# Altium footprint library ICs And Semiconductors SMD.PcbLib: 602 footprints (part 8 of 38) (continued)
## MINI-CIRCUITS_AF320 [mm] "MINI-CIRCUITS AF320 Case"
height 1.45
pads (4):
  rect 1.52x1.52 smd: 1(-2.16,0) 3(2.16,0)
  rect 2.03x1.65 smd: 2(0,-2.095) 4(0,2.095)
Top Overlay:
  circle w0.25: c-2.225,1.25 r0.125
  circle w0.2: c0,0 r0.865
  lines w0.2: -0.89,-0.255 -1.05,-0.255 -1.05,0.255 -0.89,0.255 ; -0.51,-0.749 -0.51,-0.92 0.51,-0.92 0.51,-0.749 ; -0.51,0.749 -0.51,0.92 0.51,0.92 0.51,0.749 ; 0.89,-0.255 1.05,-0.255 1.05,0.255 0.89,0.255 ; -0.89,-0.369 -0.89,0.369 -0.369,0.89 0.369,0.89 0.89,0.369 0.89,-0.369 0.369,-0.89 -0.369,-0.89 -0.89,-0.369
Mechanical 8:
  lines w0.1: -2.66,0 -2.16,0 ; -2.16,-0.5 -2.16,0 ; -2.16,0.5 -2.16,0 ; -1.66,0 -2.16,0 ; -0.5,-2.095 0,-2.095 ; -0.5,0 0,0 ; -0.5,2.095 0,2.095 ; 0,-2.595 0,-2.095 ; 0,-1.595 0,-2.095 ; 0,-1.27 0,1.27 ; 0,-0.5 0,0 ; 0,0.5 0,0 ; 0,1.595 0,2.095 ; 0,2.595 0,2.095 ; 0.5,-2.095 0,-2.095 ; 0.5,0 0,0 ; 0.5,2.095 0,2.095 ; 1.66,0 2.16,0 ; 2.16,-0.5 2.16,0 ; 2.16,0.5 2.16,0 ; 2.66,0 2.16,0 ; -2.92,-0.76 -1.4,-0.76 -1.4,0.76 -2.92,0.76 -2.92,-0.76 ; -1.015,-2.92 -1.015,-1.27 1.015,-1.27 1.015,-2.92 -1.015,-2.92 ; -1.015,1.27 -1.015,2.92 1.015,2.92 1.015,1.27 -1.015,1.27 ; 1.4,-0.76 2.92,-0.76 2.92,0.76 1.4,0.76 1.4,-0.76
Mechanical 14:
  circle w0.1: c0,0 r0.865
  lines w0.1: -2.31,-0.255 -1.8,0.255 ; -2.21,-0.255 -1.7,0.255 ; -2.11,-0.255 -1.6,0.255 ; -2.01,-0.255 -1.5,0.255 ; -0.89,-0.255 -2.54,-0.255 -2.03,0.255 -0.89,0.255 ; -0.51,-0.749 -0.51,-2.54 0.51,-2.54 0.51,-0.749 ; -0.51,0.749 -0.51,2.54 0.51,2.54 0.51,0.749 ; 0.89,-0.255 2.54,-0.255 2.54,0.255 0.89,0.255 ; -2.41,-0.255 -1.9,0.255 -2.41,-0.255 ; -0.89,-0.369 -0.89,0.369 -0.369,0.89 0.369,0.89 0.89,0.369 0.89,-0.369 0.369,-0.89 -0.369,-0.89 -0.89,-0.369
Mechanical 15:
  lines w0.05: -3.17,-1.01 -1.265,-1.01 -1.265,-3.17 1.265,-3.17 1.265,-1.01 3.17,-1.01 3.17,1.01 1.265,1.01 1.265,3.17 -1.265,3.17 -1.265,1.01 -3.17,1.01 -3.17,-1.01
3D body "MINI-CIRCUITS_AF320.stp": height 1.35, standoff 0, extent -2.54,-2.54 2.54,2.54

## MINI-CIRCUITS_CD542 [mm] "MINI-CIRCUITS CD542 Case, 2.54mm pitch; 6 pin, 5.59mm W X 7.87mm L"
height 2.84
pads (6):
  rect 2.54x1.65 smd: 1(-2.54,2.54) 2(-2.54,0) 3(-2.54,-2.54) 4(2.54,-2.54) 5(2.54,0) 6(2.54,2.54)
Top Overlay:
  circle w0.25: c-3.725,4.025 r0.125
  circle w0.6: c-0.35,2.8 r0.3
  lines w0.2: -2.795,-3.765 -2.795,-3.935 2.795,-3.935 2.795,-3.765 ; -2.795,3.765 -2.795,3.935 2.795,3.935 2.795,3.765
Mechanical 8:
  lines w0.1: -3.54,-2.54 -2.54,-2.54 ; -3.54,0 -2.54,0 ; -3.54,2.54 -2.54,2.54 ; -2.54,-3.54 -2.54,-2.54 ; -2.54,-1.54 -2.54,-2.54 ; -2.54,-1 -2.54,0 ; -2.54,1 -2.54,0 ; -2.54,1.54 -2.54,2.54 ; -2.54,3.54 -2.54,2.54 ; -1.54,-2.54 -2.54,-2.54 ; -1.54,0 -2.54,0 ; -1.54,2.54 -2.54,2.54 ; -1,0 0,0 ; 0,-1 0,0 ; 0,1 0,0 ; 1,0 0,0 ; 1.54,-2.54 2.54,-2.54 ; 1.54,0 2.54,0 ; 1.54,2.54 2.54,2.54 ; 2.54,-3.54 2.54,-2.54 ; 2.54,-1.54 2.54,-2.54 ; 2.54,-1 2.54,0 ; 2.54,1 2.54,0 ; 2.54,1.54 2.54,2.54 ; 2.54,3.54 2.54,2.54 ; 3.54,-2.54 2.54,-2.54 ; 3.54,0 2.54,0 ; 3.54,2.54 2.54,2.54
Mechanical 14:
  circle w0.1: c-1.595,2.85 r0.5
  lines w0.1: -2.795,-3.935 -2.795,3.935 2.795,3.935 2.795,-3.935 -2.795,-3.935
Mechanical 15:
  lines w0.05: -0.5,0 0.5,0 ; 0,-0.5 0,0.5 ; -4.06,-4.185 4.06,-4.185 4.06,4.185 -4.06,4.185 -4.06,-4.185
3D body "MINI-CIRCUITS_CD542.stp": height 2.84, standoff 0, extent -3.455,-3.935 3.455,3.935

## MINI-CIRCUITS_CD636 [mm] "MINI-CIRCUITS CD636 Case, 2.54mm pitch; 6 pin, 5.59mm W X 7.87mm L"
height 4.11
pads (6):
  rect 2.54x1.65 smd: 1(-2.54,2.54) 2(-2.54,0) 3(-2.54,-2.54) 4(2.54,-2.54) 5(2.54,0) 6(2.54,2.54)
Top Overlay:
  circle w0.25: c-3.725,4.025 r0.125
  circle w0.6: c-0.35,2.8 r0.3
  lines w0.2: -2.795,-3.765 -2.795,-3.935 2.795,-3.935 2.795,-3.765 ; -2.795,3.765 -2.795,3.935 2.795,3.935 2.795,3.765
Mechanical 8:
  lines w0.1: -3.54,-2.54 -2.54,-2.54 ; -3.54,0 -2.54,0 ; -3.54,2.54 -2.54,2.54 ; -2.54,-3.54 -2.54,-2.54 ; -2.54,-1.54 -2.54,-2.54 ; -2.54,-1 -2.54,0 ; -2.54,1 -2.54,0 ; -2.54,1.54 -2.54,2.54 ; -2.54,3.54 -2.54,2.54 ; -1.54,-2.54 -2.54,-2.54 ; -1.54,0 -2.54,0 ; -1.54,2.54 -2.54,2.54 ; -1,0 0,0 ; 0,-1 0,0 ; 0,1 0,0 ; 1,0 0,0 ; 1.54,-2.54 2.54,-2.54 ; 1.54,0 2.54,0 ; 1.54,2.54 2.54,2.54 ; 2.54,-3.54 2.54,-2.54 ; 2.54,-1.54 2.54,-2.54 ; 2.54,-1 2.54,0 ; 2.54,1 2.54,0 ; 2.54,1.54 2.54,2.54 ; 2.54,3.54 2.54,2.54 ; 3.54,-2.54 2.54,-2.54 ; 3.54,0 2.54,0 ; 3.54,2.54 2.54,2.54
Mechanical 14:
  circle w0.1: c-1.595,2.85 r0.5
  lines w0.1: -2.795,-3.935 -2.795,3.935 2.795,3.935 2.795,-3.935 -2.795,-3.935
Mechanical 15:
  lines w0.05: -0.5,0 0.5,0 ; 0,-0.5 0,0.5 ; -4.06,-4.185 4.06,-4.185 4.06,4.185 -4.06,4.185 -4.06,-4.185
3D body "MINI-CIRCUITS_CD636.stp": height 4.11, standoff 0, extent -3.455,-3.935 3.455,3.935

## MINI-CIRCUITS_CK605 [mm] "MINI-CIRCUITS CK605 Case, 2.54mm pitch; 12 pins, Body 12.7mm W X 12.7mm L X 4.57mm H"
height 4.57
pads (16):
  rect 1.52x1.52 smd: 1(-6.1,3.43) 2(-6.1,0.89) 3(-6.1,-1.65) 4(-6.1,-4.19) 5(-3.43,-6.1) 6(-0.89,-6.1) 7(1.65,-6.1) 8(4.19,-6.1) 9(6.1,-3.3) 10(6.1,-0.76) 11(6.1,1.78) 12(6.1,4.32) 13(4.19,6.1) 14(1.65,6.1) 15(-0.89,6.1) 16(-3.43,6.1)
Top Layer:
  region: -6.35,-0.89 -4.324,-0.89 -4.324,2.67 -6.35,2.67 -6.35,6.35 -0.13,6.35 -0.13,4.324 3.43,4.324 3.43,6.35 6.35,6.35 6.35,1.02 4.324,1.02 4.324,-2.54 6.35,-2.54 6.35,-6.35 -6.35,-6.35
Top Overlay:
  circle w0.25: c-7.4,3.475 r0.125
  lines w0.2: -6.65,-5.35 -6.65,-6.65 -4.59,-6.65 ; -6.65,4.59 -6.65,6.65 -4.59,6.65 ; 5.35,-6.65 6.65,-6.65 6.65,-4.46 ; 5.35,6.65 6.65,6.65 6.65,5.48
Mechanical 8:
  lines w0.1: -6.6,-4.19 -6.1,-4.19 ; -6.6,-1.65 -6.1,-1.65 ; -6.6,0.89 -6.1,0.89 ; -6.6,3.43 -6.1,3.43 ; -6.1,-4.69 -6.1,-4.19 ; -6.1,-3.69 -6.1,-4.19 ; -6.1,-2.15 -6.1,-1.65 ; -6.1,-1.15 -6.1,-1.65 ; -6.1,0.39 -6.1,0.89 ; -6.1,1.39 -6.1,0.89 ; -6.1,2.93 -6.1,3.43 ; -6.1,3.93 -6.1,3.43 ; -5.6,-4.19 -6.1,-4.19 ; -5.6,-1.65 -6.1,-1.65 ; -5.6,0.89 -6.1,0.89 ; -5.6,3.43 -6.1,3.43 ; -3.93,-6.1 -3.43,-6.1 ; -3.93,6.1 -3.43,6.1 ; -3.43,-6.6 -3.43,-6.1 ; -3.43,-5.6 -3.43,-6.1 ; -3.43,5.6 -3.43,6.1 ; -3.43,6.6 -3.43,6.1 ; -2.93,-6.1 -3.43,-6.1 ; -2.93,6.1 -3.43,6.1 ; -1.39,-6.1 -0.89,-6.1 ; -1.39,6.1 -0.89,6.1 ; -0.89,-6.6 -0.89,-6.1 ; -0.89,-5.6 -0.89,-6.1 ; -0.89,5.6 -0.89,6.1 ; -0.89,6.6 -0.89,6.1 ; -0.5,0 0,0 ; -0.39,-6.1 -0.89,-6.1 ; -0.39,6.1 -0.89,6.1 ; 0,-0.5 0,0 ; 0,0.5 0,0 ; 0.5,0 0,0 ; 1.15,-6.1 1.65,-6.1 ; 1.15,6.1 1.65,6.1 ; 1.65,-6.6 1.65,-6.1 ; 1.65,-5.6 1.65,-6.1 ; 1.65,5.6 1.65,6.1 ; 1.65,6.6 1.65,6.1 ; 2.15,-6.1 1.65,-6.1 ; 2.15,6.1 1.65,6.1 ; 3.69,-6.1 4.19,-6.1 ; 3.69,6.1 4.19,6.1 ; 4.19,-6.6 4.19,-6.1 ; 4.19,-5.6 4.19,-6.1 ; 4.19,5.6 4.19,6.1 ; 4.19,6.6 4.19,6.1 ; 4.69,-6.1 4.19,-6.1 ; 4.69,6.1 4.19,6.1 ; 5.6,-3.3 6.1,-3.3 ; 5.6,-0.76 6.1,-0.76 ; 5.6,1.78 6.1,1.78 ; 5.6,4.32 6.1,4.32 ; 6.1,-3.8 6.1,-3.3 ; 6.1,-2.8 6.1,-3.3 ; 6.1,-1.26 6.1,-0.76 ; 6.1,-0.26 6.1,-0.76 ; 6.1,1.28 6.1,1.78 ; 6.1,2.28 6.1,1.78 ; 6.1,3.82 6.1,4.32 ; 6.1,4.82 6.1,4.32 ; 6.6,-3.3 6.1,-3.3 ; 6.6,-0.76 6.1,-0.76 ; 6.6,1.78 6.1,1.78 ; 6.6,4.32 6.1,4.32 ; -6.86,-4.95 -6.86,-3.43 -5.34,-3.43 -5.34,-4.95 -6.86,-4.95 ; -6.86,-2.41 -6.86,-0.89 -5.34,-0.89 -5.34,-2.41 -6.86,-2.41 ; -6.86,0.13 -6.86,1.65 -5.34,1.65 -5.34,0.13 -6.86,0.13 ; -6.86,2.67 -6.86,4.19 -5.34,4.19 -5.34,2.67 -6.86,2.67 ; -6.35,-6.35 6.35,-6.35 6.35,-2.54 4.324,-2.54 4.324,1.02 6.35,1.02 6.35,6.35 3.43,6.35 3.43,4.324 -0.13,4.324 -0.13,6.35 -6.35,6.35 -6.35,2.67 -4.324,2.67 -4.324,-0.89 -6.35,-0.89 -6.35,-6.35 ; -4.19,-6.86 -4.19,-5.34 -2.67,-5.34 -2.67,-6.86 -4.19,-6.86 ; -4.19,5.34 -4.19,6.86 -2.67,6.86 -2.67,5.34 -4.19,5.34 ; -1.65,-6.86 -1.65,-5.34 -0.13,-5.34 -0.13,-6.86 -1.65,-6.86 ; -1.65,5.34 -1.65,6.86 -0.13,6.86 -0.13,5.34 -1.65,5.34 ; 0.89,-6.86 0.89,-5.34 2.41,-5.34 2.41,-6.86 0.89,-6.86 ; 0.89,5.34 0.89,6.86 2.41,6.86 2.41,5.34 0.89,5.34 ; 3.43,-6.86 3.43,-5.34 4.95,-5.34 4.95,-6.86 3.43,-6.86 ; 3.43,5.34 3.43,6.86 4.95,6.86 4.95,5.34 3.43,5.34 ; 5.34,-4.06 5.34,-2.54 6.86,-2.54 6.86,-4.06 5.34,-4.06 ; 5.34,-1.52 5.34,0 6.86,0 6.86,-1.52 5.34,-1.52 ; 5.34,1.02 5.34,2.54 6.86,2.54 6.86,1.02 5.34,1.02 ; 5.34,3.56 5.34,5.08 6.86,5.08 6.86,3.56 5.34,3.56
Mechanical 14:
  circle w0.1: c-4.28,4.28 r0.5
  lines w0.1: -6.35,-6.35 -3.95,-6.35 cw(c-3.43,-6.65) -2.91,-6.35 -1.41,-6.35 cw(c-0.89,-6.65) -0.37,-6.35 1.13,-6.35 cw(c1.65,-6.65) 2.17,-6.35 3.67,-6.35 cw(c4.19,-6.65) 4.71,-6.35 6.35,-6.35 6.35,-3.82 cw(c6.65,-3.3) 6.35,-2.78 6.35,-1.28 cw(c6.65,-0.76) 6.35,-0.24 6.35,1.26 cw(c6.65,1.78) 6.35,2.3 6.35,3.8 cw(c6.65,4.32) 6.35,4.84 6.35,6.35 4.71,6.35 cw(c4.19,6.65) 3.67,6.35 2.17,6.35 cw(c1.65,6.65) 1.13,6.35 -0.37,6.35 cw(c-0.89,6.65) -1.41,6.35 -2.91,6.35 cw(c-3.43,6.65) -3.95,6.35 -6.35,6.35 -6.35,3.95 cw(c-6.65,3.43) -6.35,2.91 -6.35,1.41 cw(c-6.65,0.89) -6.35,0.37 -6.35,-1.13 cw(c-6.65,-1.65) -6.35,-2.17 -6.35,-3.67 cw(c-6.65,-4.19) -6.35,-4.71 -6.35,-6.35 ; -5.58,-5.28 ccw(c-5.28,-5.28) -5.28,-5.58 5.28,-5.58 ccw(c5.28,-5.28) 5.58,-5.28 5.58,5.28 ccw(c5.28,5.28) 5.28,5.58 -5.28,5.58 ccw(c-5.28,5.28) -5.58,5.28 -5.58,-5.28
Mechanical 15:
  lines w0.05: -7.11,-7.11 -7.11,7.11 7.11,7.11 7.11,-7.11 -7.11,-7.11
3D body "MINI-CIRCUITS_CK605.stp": height 4.57, standoff 0, extent -6.35,-6.35 6.35,6.35

## MINI-CIRCUITS_CK1113 [mm] "MINI-CIRCUITS CK1113 Case, 2.54mm pitch; 12 pins, Body 12.7mm W X 12.7mm L X 5.59 H"
height 5.59
pads (16):
  rect 1.52x1.52 smd: 1(-6.1,3.43) 2(-6.1,0.89) 3(-6.1,-1.65) 4(-6.1,-4.19) 5(-3.43,-6.1) 6(-0.89,-6.1) 7(1.65,-6.1) 8(4.19,-6.1) 9(6.1,-3.3) 10(6.1,-0.76) 11(6.1,1.78) 12(6.1,4.32) 13(4.19,6.1) 14(1.65,6.1) 15(-0.89,6.1) 16(-3.43,6.1)
Top Layer:
  region: -6.35,-0.89 -4.324,-0.89 -4.324,2.67 -6.35,2.67 -6.35,6.35 -0.13,6.35 -0.13,4.324 3.43,4.324 3.43,6.35 6.35,6.35 6.35,1.02 4.324,1.02 4.324,-2.54 6.35,-2.54 6.35,-6.35 -6.35,-6.35
Top Overlay:
  circle w0.25: c-7.425,3.475 r0.125
  lines w0.2: -6.65,-5.35 -6.65,-6.65 -4.59,-6.65 ; -6.65,4.59 -6.65,6.65 -4.59,6.65 ; 5.35,-6.65 6.65,-6.65 6.65,-4.46 ; 5.35,6.65 6.65,6.65 6.65,5.48
Mechanical 8:
  lines w0.1: -6.6,-4.19 -6.1,-4.19 ; -6.6,-1.65 -6.1,-1.65 ; -6.6,0.89 -6.1,0.89 ; -6.6,3.43 -6.1,3.43 ; -6.1,-4.69 -6.1,-4.19 ; -6.1,-3.69 -6.1,-4.19 ; -6.1,-2.15 -6.1,-1.65 ; -6.1,-1.15 -6.1,-1.65 ; -6.1,0.39 -6.1,0.89 ; -6.1,1.39 -6.1,0.89 ; -6.1,2.93 -6.1,3.43 ; -6.1,3.93 -6.1,3.43 ; -5.6,-4.19 -6.1,-4.19 ; -5.6,-1.65 -6.1,-1.65 ; -5.6,0.89 -6.1,0.89 ; -5.6,3.43 -6.1,3.43 ; -3.93,-6.1 -3.43,-6.1 ; -3.93,6.1 -3.43,6.1 ; -3.43,-6.6 -3.43,-6.1 ; -3.43,-5.6 -3.43,-6.1 ; -3.43,5.6 -3.43,6.1 ; -3.43,6.6 -3.43,6.1 ; -2.93,-6.1 -3.43,-6.1 ; -2.93,6.1 -3.43,6.1 ; -1.39,-6.1 -0.89,-6.1 ; -1.39,6.1 -0.89,6.1 ; -0.89,-6.6 -0.89,-6.1 ; -0.89,-5.6 -0.89,-6.1 ; -0.89,5.6 -0.89,6.1 ; -0.89,6.6 -0.89,6.1 ; -0.5,0 0,0 ; -0.39,-6.1 -0.89,-6.1 ; -0.39,6.1 -0.89,6.1 ; 0,-0.5 0,0 ; 0,0.5 0,0 ; 0.5,0 0,0 ; 1.15,-6.1 1.65,-6.1 ; 1.15,6.1 1.65,6.1 ; 1.65,-6.6 1.65,-6.1 ; 1.65,-5.6 1.65,-6.1 ; 1.65,5.6 1.65,6.1 ; 1.65,6.6 1.65,6.1 ; 2.15,-6.1 1.65,-6.1 ; 2.15,6.1 1.65,6.1 ; 3.69,-6.1 4.19,-6.1 ; 3.69,6.1 4.19,6.1 ; 4.19,-6.6 4.19,-6.1 ; 4.19,-5.6 4.19,-6.1 ; 4.19,5.6 4.19,6.1 ; 4.19,6.6 4.19,6.1 ; 4.69,-6.1 4.19,-6.1 ; 4.69,6.1 4.19,6.1 ; 5.6,-3.3 6.1,-3.3 ; 5.6,-0.76 6.1,-0.76 ; 5.6,1.78 6.1,1.78 ; 5.6,4.32 6.1,4.32 ; 6.1,-3.8 6.1,-3.3 ; 6.1,-2.8 6.1,-3.3 ; 6.1,-1.26 6.1,-0.76 ; 6.1,-0.26 6.1,-0.76 ; 6.1,1.28 6.1,1.78 ; 6.1,2.28 6.1,1.78 ; 6.1,3.82 6.1,4.32 ; 6.1,4.82 6.1,4.32 ; 6.6,-3.3 6.1,-3.3 ; 6.6,-0.76 6.1,-0.76 ; 6.6,1.78 6.1,1.78 ; 6.6,4.32 6.1,4.32 ; -6.86,-4.95 -5.34,-4.95 -5.34,-3.43 -6.86,-3.43 -6.86,-4.95 ; -6.86,-2.41 -5.34,-2.41 -5.34,-0.89 -6.86,-0.89 -6.86,-2.41 ; -6.86,0.13 -5.34,0.13 -5.34,1.65 -6.86,1.65 -6.86,0.13 ; -6.86,2.67 -5.34,2.67 -5.34,4.19 -6.86,4.19 -6.86,2.67 ; -6.35,-6.35 -6.35,-0.89 -4.324,-0.89 -4.324,2.67 -6.35,2.67 -6.35,6.35 -0.13,6.35 -0.13,4.324 3.43,4.324 3.43,6.35 6.35,6.35 6.35,1.02 4.324,1.02 4.324,-2.54 6.35,-2.54 6.35,-6.35 -6.35,-6.35 ; -4.19,-6.86 -2.67,-6.86 -2.67,-5.34 -4.19,-5.34 -4.19,-6.86 ; -4.19,5.34 -2.67,5.34 -2.67,6.86 -4.19,6.86 -4.19,5.34 ; -1.65,-6.86 -0.13,-6.86 -0.13,-5.34 -1.65,-5.34 -1.65,-6.86 ; -1.65,5.34 -0.13,5.34 -0.13,6.86 -1.65,6.86 -1.65,5.34 ; 0.89,-6.86 2.41,-6.86 2.41,-5.34 0.89,-5.34 0.89,-6.86 ; 0.89,5.34 2.41,5.34 2.41,6.86 0.89,6.86 0.89,5.34 ; 3.43,-6.86 4.95,-6.86 4.95,-5.34 3.43,-5.34 3.43,-6.86 ; 3.43,5.34 4.95,5.34 4.95,6.86 3.43,6.86 3.43,5.34 ; 5.34,-4.06 6.86,-4.06 6.86,-2.54 5.34,-2.54 5.34,-4.06 ; 5.34,-1.52 6.86,-1.52 6.86,0 5.34,0 5.34,-1.52 ; 5.34,1.02 6.86,1.02 6.86,2.54 5.34,2.54 5.34,1.02 ; 5.34,3.56 6.86,3.56 6.86,5.08 5.34,5.08 5.34,3.56
Mechanical 14:
  circle w0.1: c-4.28,4.28 r0.5
  lines w0.1: -6.35,-6.35 -6.35,-4.71 ccw(c-6.65,-4.19) -6.35,-3.67 -6.35,-2.17 ccw(c-6.65,-1.65) -6.35,-1.13 -6.35,0.37 ccw(c-6.65,0.89) -6.35,1.41 -6.35,2.91 ccw(c-6.65,3.43) -6.35,3.95 -6.35,6.35 -3.95,6.35 ccw(c-3.43,6.65) -2.91,6.35 -1.41,6.35 ccw(c-0.89,6.65) -0.37,6.35 1.13,6.35 ccw(c1.65,6.65) 2.17,6.35 3.67,6.35 ccw(c4.19,6.65) 4.71,6.35 6.35,6.35 6.35,4.84 ccw(c6.65,4.32) 6.35,3.8 6.35,2.3 ccw(c6.65,1.78) 6.35,1.26 6.35,-0.24 ccw(c6.65,-0.76) 6.35,-1.28 6.35,-2.78 ccw(c6.65,-3.3) 6.35,-3.82 6.35,-6.35 4.71,-6.35 ccw(c4.19,-6.65) 3.67,-6.35 2.17,-6.35 ccw(c1.65,-6.65) 1.13,-6.35 -0.37,-6.35 ccw(c-0.89,-6.65) -1.41,-6.35 -2.91,-6.35 ccw(c-3.43,-6.65) -3.95,-6.35 -6.35,-6.35 ; -5.58,-5.28 ccw(c-5.28,-5.28) -5.28,-5.58 5.28,-5.58 ccw(c5.28,-5.28) 5.58,-5.28 5.58,5.28 ccw(c5.28,5.28) 5.28,5.58 -5.28,5.58 ccw(c-5.28,5.28) -5.58,5.28 -5.58,-5.28
Mechanical 15:
  lines w0.05: -7.11,-7.11 7.11,-7.11 7.11,7.11 -7.11,7.11 -7.11,-7.11
3D body "MINI-CIRCUITS_CK1113.stp": height 5.59, standoff 0, extent -6.35,-6.35 6.35,6.35

## MINI-CIRCUITS_DF782 [mm] "MINI-CIRCUITS DF782 Case, 1.50mm pitch; 4 pin, 2.44mm W X 4.49mm L"
height 1.6
pads (4):
  rect 0.71x1.5 smd: 1(-1.5,-1.915) 2(0,-1.915) 3(1.5,-1.915) 4(0,1.7)
Top Layer:
  region: -0.457,-0.751 -0.953,-0.255 -0.953,2.172 -0.46,2.665 0.46,2.665 0.953,2.172 0.953,-0.255 0.457,-0.751 0.457,-2.665 -0.457,-2.665
Top Overlay:
  lines w0.2: -2.255,-1.295 -2.3,-1.295 -2.3,1.295 -1.353,1.295 ; 1.353,1.295 2.3,1.295 2.3,-1.295 2.255,-1.295
Top Paste:
  region: -0.457,-0.751 -0.953,-0.255 -0.953,2.172 -0.46,2.665 0.46,2.665 0.953,2.172 0.953,-0.255 0.457,-0.751 0.457,-2.665 -0.457,-2.665
Top Solder:
  region: -0.457,-0.751 -0.953,-0.255 -0.953,2.172 -0.46,2.665 0.46,2.665 0.953,2.172 0.953,-0.255 0.457,-0.751 0.457,-2.665 -0.457,-2.665
Mechanical 8:
  lines w0.1: -1.5,-2.915 -1.5,-1.915 ; -1.5,-0.915 -1.5,-1.915 ; -1,0 0,0 ; 0,-2.915 0,-1.915 0,-0.915 ; 0,-1 0,0 ; 0,1 0,0 ; 1,0 0,0 ; 1.5,-2.915 1.5,-1.915 ; 1.5,-0.915 1.5,-1.915 ; 2.5,-1.915 1.5,-1.915 ; -1.5,-1.915 -2.5,-1.915 -1.5,-1.915 ; -1.5,-1.915 1.5,-1.915
Mechanical 14:
  lines w0.1: -1.705,-1.302 -1.705,-2.12 -1.295,-2.12 -1.295,-1.302 ; -0.825,1.295 -0.825,1.745 -0.45,2.12 0.45,2.12 0.825,1.745 0.825,1.295 ; -0.205,-1.302 -0.205,-2.12 0.205,-2.12 0.205,-1.302 ; 1.295,-1.302 1.295,-2.12 1.705,-2.12 1.705,-1.302 ; 2.3,-1.295 -2.3,-1.295 -2.3,1.295 2.3,1.295
  lines w0.2: 2.3,-1.295 2.3,1.295
Mechanical 15:
  lines w0.05: -2.55,-2.915 2.55,-2.915 2.55,2.915 -2.55,2.915 -2.55,-2.915
3D body "MINI-CIRCUITS_DF782.stp": height 1.6, standoff 0, extent -2.3,-2.12 2.3,2.12

## MINI-CIRCUITS_DG983-1 [mm] "MINI-CIRCUITS DG983-1 Case, 0.50mm Pitch, Square; 5 Pin X 5 Pin, 4mm X 4mm Body (w/Thermal Tab 2.21 X 2.21 mm)"
height 0.9
pads (21):
  rect 0.81x0.25 smd: 1(-1.845,1) 2(-1.845,0.5) 3(-1.845,0) 4(-1.845,-0.5) 5(-1.845,-1) 11(1.845,-1) 12(1.845,-0.5) 13(1.845,0) 14(1.845,0.5) 15(1.845,1)
  rect 0.25x0.81 smd: 6(-1,-1.845) 7(-0.5,-1.845) 8(0,-1.845) 9(0.5,-1.845) 10(1,-1.845) 16(1,1.845) 17(0.5,1.845) 18(0,1.845) 19(-0.5,1.845) 20(-1,1.845)
  rect 2.11x2.11 smd: 21(0,0)
Top Overlay:
  circle w0.25: c-2.6,1.95 r0.125
  lines w0.2: -2.063,-1.475 -2.063,-2.064 -1.475,-2.064 ; -2.063,1.475 -2.063,2.064 -1.475,2.064 ; 1.475,-2.064 2.064,-2.064 2.064,-1.475 ; 1.475,2.064 2.064,2.064 2.064,1.475
Mechanical 8:
  lines w0.1: -0.5,0 0,0 ; 0,-0.5 0,0 ; 0,0.5 0,0 ; 0.5,0 0,0 ; -2.25,-1.125 -1.845,-1 -2.25,-0.875 ; -2.25,-1.125 -1.44,-1.125 -1.44,-0.875 -2.25,-0.875 ; -2.25,-1.125 -2.25,-0.875 ; -2.25,-0.625 -1.845,-0.5 -2.25,-0.375 ; -2.25,-0.625 -1.44,-0.625 -1.44,-0.375 -2.25,-0.375 ; -2.25,-0.625 -2.25,-0.375 ; -2.25,-0.125 -1.845,0 -2.25,0.125 ; -2.25,-0.125 -1.44,-0.125 -1.44,0.125 -2.25,0.125 ; -2.25,-0.125 -2.25,0.125 ; -2.25,0.375 -1.845,0.5 -2.25,0.625 ; -2.25,0.375 -1.44,0.375 -1.44,0.625 -2.25,0.625 ; -2.25,0.375 -2.25,0.625 ; -2.25,0.875 -1.845,1 -2.25,1.125 ; -2.25,0.875 -1.44,0.875 -1.44,1.125 -2.25,1.125 ; -2.25,0.875 -2.25,1.125 ; -1.125,-2.25 -1,-1.845 -0.875,-2.25 ; -1.125,-2.25 -1.125,-1.44 -0.875,-1.44 -0.875,-2.25 ; -1.125,-2.25 -0.875,-2.25 ; -1.125,2.25 -1,1.845 -0.875,2.25 ; -1.125,2.25 -1.125,1.44 -0.875,1.44 -0.875,2.25 ; -1.125,2.25 -0.875,2.25 ; -0.625,-2.25 -0.5,-1.845 -0.375,-2.25 ; -0.625,-2.25 -0.625,-1.44 -0.375,-1.44 -0.375,-2.25 ; -0.625,-2.25 -0.375,-2.25 ; -0.625,2.25 -0.5,1.845 -0.375,2.25 ; -0.625,2.25 -0.625,1.44 -0.375,1.44 -0.375,2.25 ; -0.625,2.25 -0.375,2.25 ; -0.125,-2.25 0,-1.845 0.125,-2.25 ; -0.125,-2.25 -0.125,-1.44 0.125,-1.44 0.125,-2.25 ; -0.125,-2.25 0.125,-2.25 ; -0.125,2.25 0,1.845 0.125,2.25 ; -0.125,2.25 -0.125,1.44 0.125,1.44 0.125,2.25 ; -0.125,2.25 0.125,2.25 ; 0.375,-2.25 0.5,-1.845 0.625,-2.25 ; 0.375,-2.25 0.375,-1.44 0.625,-1.44 0.625,-2.25 ; 0.375,-2.25 0.625,-2.25 ; 0.375,2.25 0.5,1.845 0.625,2.25 ; 0.375,2.25 0.375,1.44 0.625,1.44 0.625,2.25 ; 0.375,2.25 0.625,2.25 ; 0.875,-2.25 1,-1.845 1.125,-2.25 ; 0.875,-2.25 0.875,-1.44 1.125,-1.44 1.125,-2.25 ; 0.875,-2.25 1.125,-2.25 ; 0.875,2.25 1,1.845 1.125,2.25 ; 0.875,2.25 0.875,1.44 1.125,1.44 1.125,2.25 ; 0.875,2.25 1.125,2.25 ; 2.25,-1.125 1.845,-1 2.25,-0.875 ; 2.25,-1.125 1.44,-1.125 1.44,-0.875 2.25,-0.875 ; 2.25,-1.125 2.25,-0.875 ; 2.25,-0.625 1.845,-0.5 2.25,-0.375 ; 2.25,-0.625 1.44,-0.625 1.44,-0.375 2.25,-0.375 ; 2.25,-0.625 2.25,-0.375 ; 2.25,-0.125 1.845,0 2.25,0.125 ; 2.25,-0.125 1.44,-0.125 1.44,0.125 2.25,0.125 ; 2.25,-0.125 2.25,0.125 ; 2.25,0.375 1.845,0.5 2.25,0.625 ; 2.25,0.375 1.44,0.375 1.44,0.625 2.25,0.625 ; 2.25,0.375 2.25,0.625 ; 2.25,0.875 1.845,1 2.25,1.125 ; 2.25,0.875 1.44,0.875 1.44,1.125 2.25,1.125 ; 2.25,0.875 2.25,1.125 ; -1.055,-1.055 1.055,-1.055 1.055,1.055 -1.055,1.055 -1.055,-1.055
Mechanical 14:
  lines w0.1: -2.063,1.463 -1.463,2.064 ; -2.063,1.563 -1.563,2.064 ; -2.063,1.663 -1.663,2.064 ; -2.063,1.763 -1.763,2.064 ; -2.063,1.863 -1.863,2.064 ; -2.063,1.964 -1.963,2.064 ; -2.063,-2.064 -2.063,2.064 2.064,2.064 2.064,-2.064 -2.063,-2.064
Mechanical 15:
  lines w0.05: -2.5,-2.5 -2.5,2.5 2.5,2.5 2.5,-2.5 -2.5,-2.5
3D body "MINI-CIRCUITS_DG983-1.stp": height 0.9, standoff 0, extent -2.063,-2.063 2.064,2.064

## MINI-CIRCUITS_DZ943 [mm] "MINI-CIRCUITS TDZ943 Case, 10 pin,  7.62mm W X 6.35mm L"
height 5.83
pads (10):
  rect 2.16x0.76 smd: 1(-2.73,2.54) 2(-2.73,1.27) 3(-2.73,0) 4(-2.73,-1.27) 5(-2.73,-2.54) 6(2.73,-2.54) 7(2.73,-1.27) 8(2.73,0) 9(2.73,1.27) 10(2.73,2.54)
Top Overlay:
  circle w0.25: c-4.3,2.54 r0.125
  lines w0.2: -3.175,-3.32 -3.175,-3.81 3.175,-3.81 3.175,-3.32 ; -3.175,3.32 -3.175,3.81 3.175,3.81 3.175,3.32
Mechanical 8:
  lines w0.1: -3.73,-2.54 -2.73,-2.54 ; -3.73,-1.27 -2.73,-1.27 -1.73,-1.27 ; -3.73,0 -2.73,0 -1.73,0 ; -3.73,1.27 -2.73,1.27 -1.73,1.27 ; -3.73,2.54 -2.73,2.54 ; -1.73,-2.54 -2.73,-2.54 ; -1.73,2.54 -2.73,2.54 ; -1,0 0,0 ; 0,-1 0,0 ; 0,1 0,0 ; 1,0 0,0 ; 1.73,-2.54 2.73,-2.54 ; 1.73,-1.27 2.73,-1.27 3.73,-1.27 ; 1.73,0 2.73,0 3.73,0 ; 1.73,1.27 2.73,1.27 3.73,1.27 ; 1.73,2.54 2.73,2.54 ; 3.73,-2.54 2.73,-2.54 ; 3.73,2.54 2.73,2.54 ; -2.73,-2.54 -2.73,2.54 ; 2.73,-2.54 2.73,2.54
Mechanical 14:
  circle w0.1: c-1.805,2.44 r0.4
  lines w0.1: -3.175,-2.69 -3.38,-2.69 -3.38,-2.39 -3.175,-2.39 ; -3.175,-1.42 -3.38,-1.42 -3.38,-1.12 -3.175,-1.12 ; -3.175,-0.15 -3.38,-0.15 -3.38,0.15 -3.175,0.15 ; -3.175,1.12 -3.38,1.12 -3.38,1.42 -3.175,1.42 ; -3.175,2.39 -3.38,2.39 -3.38,2.69 -3.175,2.69 ; 3.175,-2.69 3.38,-2.69 3.38,-2.39 3.175,-2.39 ; 3.175,-1.42 3.38,-1.42 3.38,-1.12 3.175,-1.12 ; 3.175,-0.15 3.38,-0.15 3.38,0.15 3.175,0.15 ; 3.175,1.12 3.38,1.12 3.38,1.42 3.175,1.42 ; 3.175,2.39 3.38,2.39 3.38,2.69 3.175,2.69 ; -3.175,-3.81 -3.175,3.81 3.175,3.81 3.175,-3.81 -3.175,-3.81 ; -2.805,-3.44 -2.805,3.44 2.805,3.44 2.805,-3.44 -2.805,-3.44
Mechanical 15:
  lines w0.05: -4.06,-4.06 -4.06,4.06 4.06,4.06 4.06,-4.06 -4.06,-4.06
3D body "MINI-CIRCUITS_DZ943.stp": height 4.83, standoff 0, extent -3.38,-3.81 3.38,3.81

## MINI-CIRCUITS_FG873 [mm] "MINI-CIRCUITS FG873 Case, 4 pin, 3.0mm W X 3.0mm L"
height 0.89
pads (4):
  rect 1.55x0.61 smd: 1(-1.585,0) 3(1.585,0)
  rect 0.61x1.55 smd: 2(0,-1.585) 4(0,1.585)
Top Layer:
  region: -0.305,2.36 -0.305,-2.36 0.305,-2.36 0.305,2.36
Top Overlay:
  circle w0.25: c-2.05,-0.95 r0.125
  lines w0.2: -1.487,-0.705 -0.705,-1.487 ; -1.487,0.705 -0.705,1.487 ; 0.705,-1.487 1.487,-0.705 ; 0.705,1.487 1.487,0.705
Mechanical 8:
  lines w0.1: -2.085,0 -1.585,0 ; -1.585,-0.5 -1.585,0 ; -1.585,0.5 -1.585,0 ; -1.085,0 -1.585,0 ; -0.5,-1.585 0,-1.585 ; -0.5,0 0,0 ; -0.5,1.585 0,1.585 ; 0,-2.085 0,-1.585 ; 0,-1.085 0,-1.585 ; 0,-0.5 0,0 ; 0,0.5 0,0 ; 0,1.085 0,1.585 ; 0,2.085 0,1.585 ; 0.5,-1.585 0,-1.585 ; 0.5,0 0,0 ; 0.5,1.585 0,1.585 ; 1.085,0 1.585,0 ; 1.585,-0.5 1.585,0 ; 1.585,0.5 1.585,0 ; 2.085,0 1.585,0 ; -2.36,-0.305 -0.81,-0.305 -0.81,0.305 -2.36,0.305 -2.36,-0.305 ; -0.305,-2.36 -0.305,-0.81 0.305,-0.81 0.305,-2.36 -0.305,-2.36 ; -0.305,0.81 -0.305,2.36 0.305,2.36 0.305,0.81 -0.305,0.81 ; 0.81,-0.305 2.36,-0.305 2.36,0.305 0.81,0.305 0.81,-0.305
Mechanical 14:
  lines w0.1: -2.192,0 0,2.192 2.192,0 0,-2.192 -2.192,0
Mechanical 15:
  lines w0.05: -2.537,-0.482 -2.537,0.482 -0.482,2.537 0.482,2.537 2.537,0.482 2.537,-0.482 0.482,-2.537 -0.482,-2.537 -2.537,-0.482
3D body "MINI-CIRCUITS_FG873.stp": height 0.89, standoff 0, extent -2.171,-2.171 2.171,2.171

## MINI-CIRCUITS_GP731 [mil] "MINI-CIRCUITS GP731 Case, 8 Pin, 8.89mm W X 8.89mm L"
height 100
pads (8):
  rect 70x40 smd: 1(-160,75) 2(-160,0) 3(-160,-75) 5(160,-75) 6(160,0) 7(160,75)
  rect 40x70 smd: 4(0,-160.04) 8(0,160)
Top Layer:
  region: -195,-195 -195,-95 -125,-95 -125,-55 -95,-55 -95,55 -125,55 -125,95 -195,95 -195,171.14 -171.14,195 -55,195 -55,95 55,95 55,195 195,195 195,95 125,95 125,55 95,55 95,-55 125,-55 125,-95 195,-95 195,-195 55,-195 55,-95 -55,-95 -55,-195
Top Overlay:
  circle w3.94: c-139.57,135.63 r11.81
  circle w9.84: c-202.03,139.76 r4.92
  lines w7.87: -175,-111.81 -175,-175 -54.92,-175 ; -175,111.81 -175,175 -54.92,175 ; 54.92,-175 175,-175 175,-111.81 ; 54.92,175 175,175 175,111.81
Mechanical 8:
  lines w3.94: -179.69,-75 -160,-75 ; -179.69,0 -160,0 ; -179.69,75 -160,75 ; -160,-94.69 -160,-75 ; -160,-55.31 -160,-75 ; -160,-19.69 -160,0 ; -160,19.69 -160,0 ; -160,55.31 -160,75 ; -160,94.69 -160,75 ; -140.31,-75 -160,-75 ; -140.31,0 -160,0 ; -140.31,75 -160,75 ; -19.68,-160 0,-160 ; -19.69,0 0,0 ; -19.68,160 0,160 ; 0,-179.69 0,-160 ; 0,-140.31 0,-160 ; 0,-19.69 0,0 ; 0,19.69 0,0 ; 0,140.31 0,160 ; 0,179.69 0,160 ; 19.69,-160 0,-160 ; 19.69,0 0,0 ; 19.69,160 0,160 ; 140.31,-75 160,-75 ; 140.31,0 160,0 ; 140.31,75 160,75 ; 160,-94.69 160,-75 ; 160,-55.31 160,-75 ; 160,-19.69 160,0 ; 160,19.68 160,0 ; 160,55.31 160,75 ; 160,94.69 160,75 ; 179.69,-75 160,-75 ; 179.69,0 160,0 ; 179.69,75 160,75 ; -195,-95 -125,-95 ; -195,-95 -195,-195 -55,-195 -55,-95 55,-95 55,-195 195,-195 195,-95 ; -195,-95 -195,-55 -125,-55 ; -195,-95 -125,-95 ; -195,95 -195,195 -55,195 -55,95 55,95 55,195 195,195 195,95 ; -195,95 -125,95 ; -195,95 -195,55 -125,55 ; -195,95 -125,95 ; -125,-95 -125,-55 ; -125,-95 -125,-55 ; -125,-55 -95,-55 -95,55 -125,55 ; -125,55 -125,95 ; -125,55 -125,95 ; 125,-95 125,-55 ; 125,-95 195,-95 ; 125,-95 125,-55 ; 125,-95 195,-95 ; 125,-55 95,-55 95,55 125,55 ; 125,-55 195,-55 195,-95 ; 125,55 125,95 ; 125,55 125,95 ; 125,55 195,55 195,95 ; 125,95 195,95 ; 125,95 195,95 ; -195,-20 -195,20 -125,20 -125,-20 -195,-20 ; -20,-195 20,-195 20,-125 -20,-125 -20,-195 ; -20,125 20,125 20,195 -20,195 -20,125 ; 125,-20 125,20 195,20 195,-20 125,-20
Mechanical 14:
  circle w3.94: c-139.57,135.63 r11.81
  lines w3.94: -175,-175 -175,175 175,175 175,-175 -175,-175
Mechanical 15:
  lines w1.97: -204.84,-204.84 -204.84,204.84 204.84,204.84 204.84,-204.84 -204.84,-204.84
3D body "MINI-CIRCUITS_GP731.stp": height 100, standoff 0, extent -175,-175 175,175

## MINI-CIRCUITS_HV1195 [mm] "MINI-CIRCUITS HV1195 Case, 1.27mm pitch; 8 pin, 4.57mm W X 5.08mm L"
height 2.21
pads (8):
  rect 1.52x0.76 smd: 1(-2.265,1.905) 2(-2.265,0.635) 3(-2.265,-0.635) 4(-2.265,-1.905) 5(2.265,-1.905) 6(2.265,-0.635) 7(2.265,0.635) 8(2.265,1.905)
Top Layer:
  region: -0.635,-2.285 -0.635,-1.015 -3.025,-1.015 -3.025,-0.255 -0.635,-0.255 -0.635,1.525 -3.025,1.525 -3.025,2.285 0.635,2.285 0.635,1.015 3.025,1.015 3.025,0.255 1.505,0.255 1.505,-0.255 3.025,-0.255 3.025,-1.015 1.505,-1.015 1.505,-1.525 3.025,-1.525 3.025,-2.285
Top Overlay:
  circle w0.25: c-3.625,1.915 r0.125
  lines w0.2: -2.54,-2.585 2.54,-2.585 ; -2.54,2.586 2.54,2.585
Mechanical 8:
  lines w0.1: -2.765,-1.905 -2.265,-1.905 ; -2.765,-0.635 -2.265,-0.635 ; -2.765,0.635 -2.265,0.635 ; -2.765,1.905 -2.265,1.905 ; -2.265,-2.405 -2.265,-1.905 ; -2.265,-1.405 -2.265,-1.905 ; -2.265,-1.135 -2.265,-0.635 ; -2.265,-0.135 -2.265,-0.635 ; -2.265,0.135 -2.265,0.635 ; -2.265,1.135 -2.265,0.635 ; -2.265,1.405 -2.265,1.905 ; -2.265,2.405 -2.265,1.905 ; -1.765,-1.905 -2.265,-1.905 ; -1.765,-0.635 -2.265,-0.635 ; -1.765,0.635 -2.265,0.635 ; -1.765,1.905 -2.265,1.905 ; -0.5,0 0,0 ; 0,-0.5 0,0 ; 0,0.5 0,0 ; 0.5,0 0,0 ; 1.765,-1.905 2.265,-1.905 ; 1.765,-0.635 2.265,-0.635 ; 1.765,0.635 2.265,0.635 ; 1.765,1.905 2.265,1.905 ; 2.265,-2.405 2.265,-1.905 ; 2.265,-1.405 2.265,-1.905 ; 2.265,-1.135 2.265,-0.635 ; 2.265,-0.135 2.265,-0.635 ; 2.265,0.135 2.265,0.635 ; 2.265,1.135 2.265,0.635 ; 2.265,1.405 2.265,1.905 ; 2.265,2.405 2.265,1.905 ; 2.765,-1.905 2.265,-1.905 ; 2.765,-0.635 2.265,-0.635 ; 2.765,0.635 2.265,0.635 ; 2.765,1.905 2.265,1.905 ; -3.025,-2.285 -3.025,-1.525 -1.505,-1.525 -1.505,-2.285 -3.025,-2.285 ; -3.025,-1.015 -3.025,-0.255 -0.635,-0.255 -0.635,1.525 -3.025,1.525 -3.025,2.285 0.635,2.285 0.635,1.015 3.025,1.015 3.025,0.255 1.505,0.255 1.505,-0.255 3.025,-0.255 3.025,-1.015 1.505,-1.015 1.505,-1.525 3.025,-1.525 3.025,-2.285 -0.635,-2.285 -0.635,-1.015 -3.025,-1.015 ; -3.025,0.255 -3.025,1.015 -1.505,1.015 -1.505,0.255 -3.025,0.255 ; 1.505,1.525 1.505,2.285 3.025,2.285 3.025,1.525 1.505,1.525
Mechanical 14:
  circle w0.1: c-1.44,1.185 r0.25
  lines w0.1: -2.54,-2.285 2.54,-2.285 2.54,2.285 -2.54,2.285 -2.54,-2.285 ; -2.24,-1.185 ccw(c-1.44,-1.185) -1.44,-1.985 1.44,-1.985 ccw(c1.44,-1.185) 2.24,-1.185 2.24,1.185 ccw(c1.44,1.185) 1.44,1.985 -1.44,1.985 ccw(c-1.44,1.185) -2.24,1.185 -2.24,-1.185
Mechanical 15:
  lines w0.1: -3.275,-2.535 -3.275,2.535 3.275,2.534 3.275,-2.535 -3.275,-2.535
3D body "MINI-CIRCUITS_HV1195.stp": height 2.21, standoff 0, extent -2.54,-2.285 2.54,2.285